# Altium footprint library IDCI_WifiNode_2_R00.PcbLib: 19 footprints (part 2 of 2)
Each footprint in its own frame and in the unit in brackets; x right, y up, seen from the top. Pads: shape width x height; smd on the part's side, far side on the other; paste and mask are expansions set on the pad; w line width, h text height; cw(c..) or ccw(c..) is an arc to the next point about the centre after c.
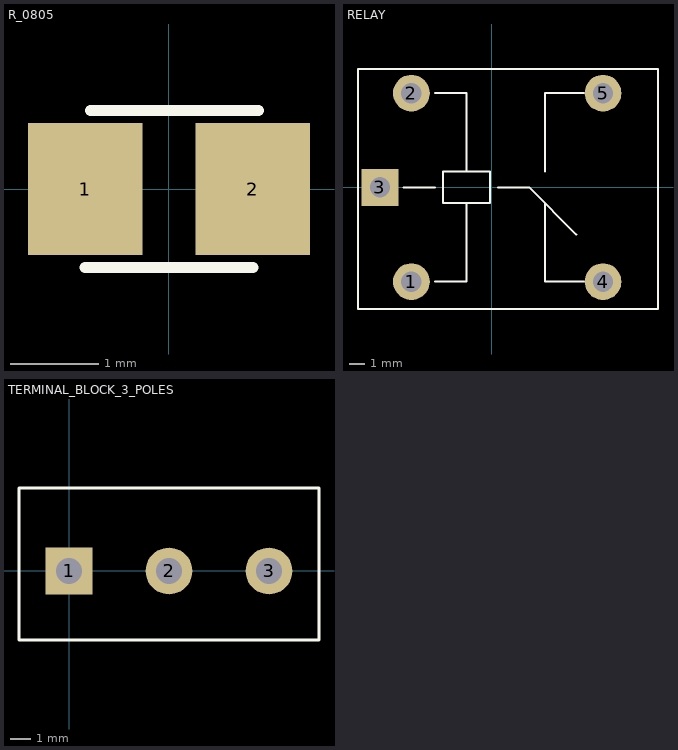
[diagram p1: the footprints below, top view; thin cyan lines are the x and y axes]

## R_0805 [mm]
pads (2):
  rect 1.3x1.5 smd: 1(-0.95,0) 2(0.95,0)
Top Overlay:
  lines w0.127: -0.953,-0.889 -0.476,-0.889 0.476,-0.889 0.953,-0.889 ; -0.889,0.889 1.016,0.889
3D body "RESC-0805.stp": height 0.6, standoff 0, extent -1.02,-0.685 1.08,0.665

## RELAY [mm]
pads (5):
  round 2.34 hole 1.3: 1(-5.1,-6) 2(-5.1,6) 4(7.1,-6) 5(7.1,6)
  rect 2.34x2.34 hole 1.3: 3(-7.1,0)
Top Overlay:
  lines w0.127: -5.6,0 -3.6,0 ; -3.6,-6 -1.6,-6 -1.6,-1 ; -3.6,6 -1.6,6 -1.6,1 ; 0.4,0 1.9,0 2.4,0 5.4,-3 ; 3.4,-1 3.4,-6 5.9,-6 ; 3.4,1 3.4,6 3.9,6 5.9,6 ; -1.6,-1 -0.1,-1 -0.1,1 -1.6,1 ; -1.6,-1 -3.1,-1 -3.1,1 -1.6,1 ; 5.4,-3 5.4,-3 ; -8.5,-7.75 10.6,-7.75 10.6,7.55 -8.5,7.55 -8.5,-7.75
3D body "RELAY.stp": height 19, standoff -3.5, extent -9.69,-8.52 13.01,8.38

## TERMINAL_BLOCK_3_POLES [mm]
pads (3):
  rect 2.34x2.34 hole 1.3: 1(0,0)
  round 2.34 hole 1.3: 2(5,0) 3(10,0)
Top Overlay:
  lines w0.127: -2.5,-3.45 12.5,-3.45 12.5,4.15 -2.5,4.15 -2.5,-3.45
Mechanical 15:
  lines w0.127: 0,0 0.05,0.05
3D body "Bornera-3-vias.stp": height 10, standoff -4.1, extent -3.1,-3.1 12.5,4.5